# Altium footprint library Miscellaneous Devices LC.PcbLib: 733 footprints (part 1 of 46)
Each footprint in its own frame and in the unit in brackets; x right, y up, seen from the top. Pads: shape width x height; smd on the part's side, far side on the other; paste and mask are expansions set on the pad; w line width, h text height; cw(c..) or ccw(c..) is an arc to the next point about the centre after c.
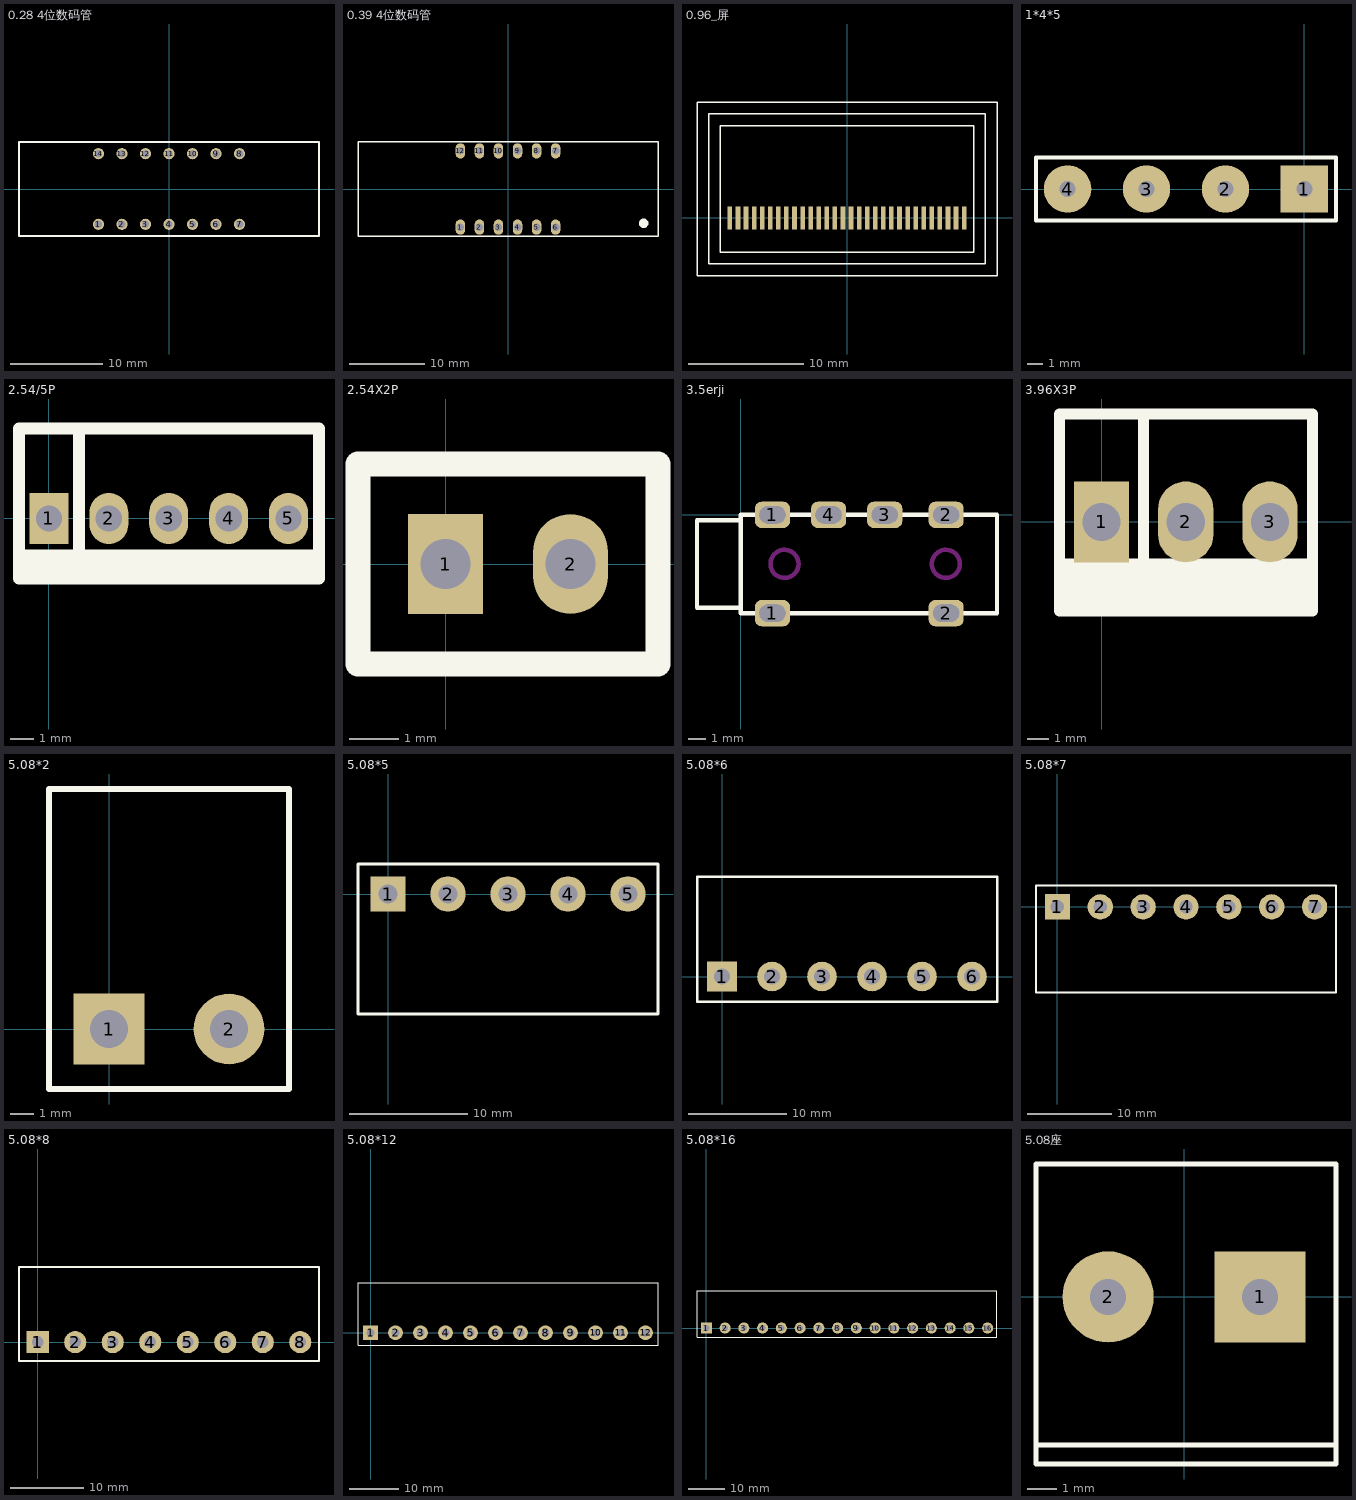
[diagram p0: the footprints below, top view; thin cyan lines are the x and y axes]

## 0.28 4位数码管 [mm]
pads (14):
  round 1.2 hole 0.8: 1(-7.62,-3.81) 2(-5.08,-3.81) 3(-2.54,-3.81) 4(0,-3.81) 5(2.54,-3.81) 6(5.08,-3.81) 7(7.62,-3.81) 8(7.62,3.81) 9(5.08,3.81) 10(2.54,3.81) 11(0,3.81) 12(-2.54,3.81) 13(-5.08,3.81) 14(-7.62,3.81)
Top Overlay:
  lines w0.254: -16.192,-5.08 -16.192,5.08 -8.89,5.08 8.89,5.08 16.192,5.08 16.192,-5.08 8.89,-5.08 -8.89,-5.08 -16.192,-5.08

## 0.39 4位数码管 [mm]
pads (12):
  oval 1.27x2.032 hole 1: 1(-6.35,-5.08) 2(-3.81,-5.08) 3(-1.27,-5.08) 4(1.27,-5.08) 5(3.81,-5.08) 6(6.35,-5.08) 7(6.35,5.08) 8(3.81,5.08) 9(1.27,5.08) 10(-1.27,5.08) 11(-3.81,5.08) 12(-6.35,5.08)
Top Overlay:
  circle w0.85: c18.088,-4.572 r0.2
  lines w0.2: -20,-6.3 -20,6.3 20,6.3 20,-6.3 -20,-6.3
3D body: height 4, standoff 0.25, extent -19.939,-6.223 19.939,6.223

## 0.96_屏 [mm]
pads (30):
  rect 0.4x2 smd: 1(-10.15,0) 2(-9.45,0) 3(-8.75,0) 4(-8.05,0) 5(-7.35,0) 6(-6.65,0) 7(-5.95,0) 8(-5.25,0) 9(-4.55,0) 10(-3.85,0) 11(-3.15,0) 12(-2.45,0) 13(-1.75,0) 14(-1.05,0) 15(-0.35,0) 16(0.35,0) 17(1.05,0) 18(1.75,0) 19(2.45,0) 20(3.15,0) 21(3.85,0) 22(4.55,0) 23(5.25,0) 24(5.95,0) 25(6.65,0) 26(7.35,0) 27(8.05,0) 28(8.75,0) 29(9.45,0) 30(10.15,0)
Top Overlay:
  lines w0.127: -13,-5 13,-5 13,10 -13,10 -13,-5 ; -12,-4 12,-4 12,9 -12,9 -12,-4 ; -11,-3 11,-3 11,8 -11,8 -11,-3

## 1*4*5 [mm]
pads (4):
  rect 3x3 hole 1: 1(0,0)
  round 3 hole 1: 2(-5,0) 3(-10,0) 4(-15,0)
Top Overlay:
  lines w0.254: -17,-2 -17,2 2,2 2,-2 -17,-2

## 2.54/5P [mil]
pads (5):
  rect 65x85 hole 44: 1(0,0)
  oval 65x85 hole 44: 2(100,0) 3(200,0) 4(300,0) 5(400,0)
Top Overlay:
  region: 452,-100 452,-52 -47,-52 -47,-100
  lines w20: 50,-100 50,150 ; -50,-100 451,-100 451,150 -50,150 -50,-100

## 2.54X2P [mil]
pads (2):
  rect 60x80 hole 40: 1(0,0)
  oval 60x80 hole 40: 2(100,0)
Top Overlay:
  lines w20: -70,-80 -70,80 170,80 170,-80 -70,-80

## 3.5erji [mm]
pads (6):
  rrect50% 2x1.5 hole 1.5 slot 1 at 90 deg: 1(1.8,-5.6) 1(1.8,0) 2(11.7,-5.6) 2(11.7,0) 3(8.2,0) 4(5,0)
Top Overlay:
  lines w0.254: -2.5,-0.294 -2.5,-5.294 -1.27,-5.294 ; -2.46,-0.294 -1.651,-0.294 -0.04,-0.294 ; -1.651,-5.294 -0.04,-5.294 ; 0,-5.6 0,0 14.6,0 14.6,-5.6 ; 0.012,-5.6 11.7,-5.6 14.593,-5.6
Keep-Out Layer:
  circle w0.254: c11.684,-2.794 r0.8
  circle w0.254: c2.489,-2.794 r0.8

## 3.96X3P [mm]
pads (3):
  rect 2.6x3.81 hole 1.8: 1(0,0)
  oval 2.6x3.81 hole 1.8: 2(3.962,0) 3(7.925,0)
Top Overlay:
  region: 9.931,-4.191 9.931,-1.981 -1.981,-1.981 -1.981,-4.191
  lines w0.508: -1.981,-1.981 9.931,-1.981 ; 1.981,-1.981 1.981,5.08 ; -1.981,-4.191 9.931,-4.191 9.931,5.08 -1.981,5.08 -1.981,-4.191

## 5.08*2 [mm]
pads (2):
  rect 3x3 hole 1.6: 1(0,0)
  round 3 hole 1.6: 2(5.08,0)
Top Overlay:
  lines w0.254: -2.54,-2.54 -2.54,10.16 7.62,10.16 7.62,-2.54 -2.54,-2.54

## 5.08*5 [mm]
pads (5):
  rect 3x3 hole 1.6: 1(0,0)
  round 3 hole 1.6: 2(5.08,0) 3(10.16,0) 4(15.24,0) 5(20.32,0)
Top Overlay:
  lines w0.254: -2.54,-10.16 22.86,-10.16 22.86,2.54 -2.54,2.54 -2.54,-10.16

## 5.08*6 [mm]
pads (6):
  rect 3x3 hole 1.6: 1(0,0)
  round 3 hole 1.6: 2(5.08,0) 3(10.16,0) 4(15.24,0) 5(20.32,0) 6(25.4,0)
Top Overlay:
  lines w0.254: -2.54,-2.54 27.94,-2.54 27.94,10.16 -2.54,10.16 -2.54,-2.54

## 5.08*7 [mm]
pads (7):
  rect 3x3 hole 1.6: 1(0,0)
  round 3 hole 1.6: 2(5.08,0) 3(10.16,0) 4(15.24,0) 5(20.32,0) 6(25.4,0) 7(30.48,0)
Top Overlay:
  lines w0.254: -2.54,-10.16 -2.54,2.54 33.02,2.54 33.02,-10.16 -2.54,-10.16

## 5.08*8 [mm]
pads (8):
  rect 3x3 hole 1.6: 1(0,0)
  round 3 hole 1.6: 2(5.08,0) 3(10.16,0) 4(15.24,0) 5(20.32,0) 6(25.4,0) 7(30.48,0) 8(35.56,0)
Top Overlay:
  lines w0.254: -2.54,-2.54 -2.54,10.16 38.1,10.16 38.1,-2.54 -2.54,-2.54

## 5.08*12 [mm]
pads (12):
  rect 3x3 hole 1.6: 1(0,0)
  round 3 hole 1.6: 2(5.08,0) 3(10.16,0) 4(15.24,0) 5(20.32,0) 6(25.4,0) 7(30.48,0) 8(35.56,0) 9(40.64,0) 10(45.72,0) 11(50.8,0) 12(55.88,0)
Top Overlay:
  lines w0.254: -2.54,-2.54 -2.54,10.16 58.42,10.16 58.42,-2.54 -2.54,-2.54

## 5.08*16 [mm]
pads (16):
  rect 3x3 hole 1.6: 1(0,0)
  round 3 hole 1.6: 2(5.08,0) 3(10.16,0) 4(15.24,0) 5(20.32,0) 6(25.4,0) 7(30.48,0) 8(35.56,0) 9(40.64,0) 10(45.72,0) 11(50.8,0) 12(55.88,0) 13(60.96,0) 14(66.04,0) 15(71.12,0) 16(76.2,0)
Top Overlay:
  lines w0.254: -2.54,-2.54 -2.54,10.16 78.74,10.16 78.74,-2.54 -2.54,-2.54

## 5.08座 [mil]
pads (2):
  rect 120x120 hole 47.24: 1(100,0)
  round 120 hole 47.24: 2(-100,0)
Top Overlay:
  lines w7: -195,-220 -195,173.7 ; -195,-195 195,-195 ; -195,175 198.7,175 ; -193.7,-220 200,-220 ; 200,-218.7 200,175